# Altium footprint library pcb_library.PcbLib: 45 footprints (part 3 of 3)
Each footprint in its own frame and in the unit in brackets; x right, y up, seen from the top. Pads: shape width x height; smd on the part's side, far side on the other; paste and mask are expansions set on the pad; w line width, h text height; cw(c..) or ccw(c..) is an arc to the next point about the centre after c.
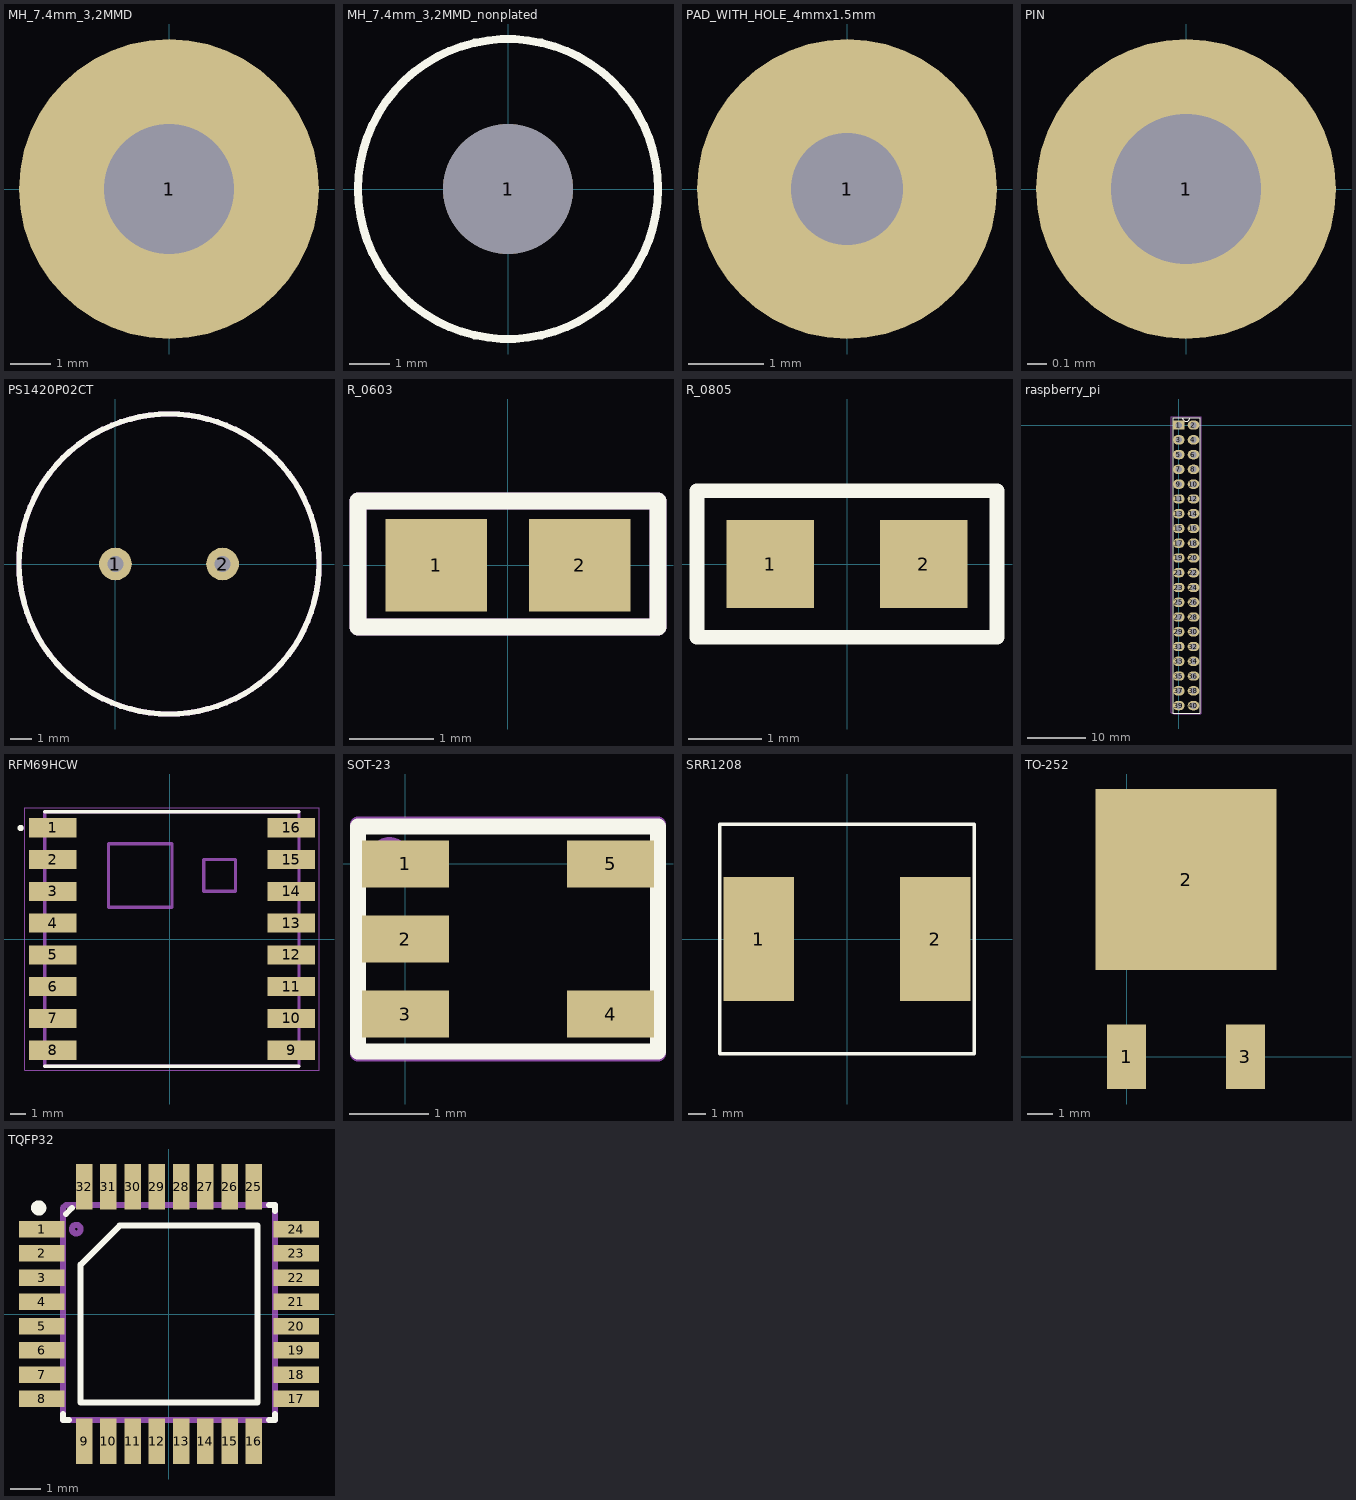
[diagram p2: the footprints below, top view; thin cyan lines are the x and y axes]

## MH_7.4mm_3,2MMD [mm]
pads (1):
  round 7.4 hole 3.2: 1(0,0)

## MH_7.4mm_3,2MMD_nonplated [mm]
pads (1):
  round 3.2 hole 3.2 unplated: 1(0,0)
Top Overlay:
  circle w0.2: c0,0 r3.7

## PAD_WITH_HOLE_4mmx1.5mm [mm]
pads (1):
  round 4 hole 1.5: 1(0,0)

## PIN [mil]
pads (1):
  round 60 hole 30: 1(0,0)

## PS1420P02CT [mil]
pads (2):
  round 60 hole 30: 1(0,0) 2(196.85,0)
Top Overlay:
  circle w10: c98.43,0 r275.59
Mechanical 29:
  circle w10: c98.43,0 r275.59
3D body: height 314.96, standoff 0, extent -177.16,-275.59 374.02,275.59

## R_0603 [mm]
pads (2):
  rect 1.2x1.1 smd: 1(-0.85,0) 2(0.85,0)
Top Overlay:
  lines w0.2: -1.778,-0.73 -1.778,0.478 -1.778,0.762 1.778,0.762 1.778,-0.73 -1.778,-0.73
Mechanical 29:
  lines w0.2: -1.778,-0.73 -1.778,0.762 1.778,0.762 1.778,-0.73 -1.778,-0.73
  text ".Designator" at -1.524,-0.21 h0.8
3D body "RC0603FR-071ML.stp": height 0.55, standoff 0, extent -0.8,-0.4 0.8,0.4

## R_0805 [mm]
pads (2):
  rect 1.2x1.2 smd: 1(-1.05,0) 2(1.05,0)
Top Overlay:
  lines w0.2: -2.05,-1 2.05,-1 2.05,1 -2.05,1 -2.05,0 -2.05,-1
3D body "RC0805FR-0722RL.stp": height 0.6, standoff 0, extent -1,-0.625 1,0.625

## raspberry_pi [mm]
pads (40):
  rect 2x1.6 hole 1.1: 1(0,0)
  oval 2x1.6 hole 1.1: 2(2.54,0) 3(0,-2.54) 4(2.54,-2.54) 5(0,-5.08) 6(2.54,-5.08) 7(0,-7.62) 8(2.54,-7.62) 9(0,-10.16) 10(2.54,-10.16) 11(0,-12.7) 12(2.54,-12.7) 13(0,-15.24) 14(2.54,-15.24) 15(0,-17.78) 16(2.54,-17.78) 17(0,-20.32) 18(2.54,-20.32) 19(0,-22.86) 20(2.54,-22.86) 21(0,-25.4) 22(2.54,-25.4) 23(0,-27.94) 24(2.54,-27.94) 25(0,-30.48) 26(2.54,-30.48) 27(0,-33.02) 28(2.54,-33.02) 29(0,-35.56) 30(2.54,-35.56) 31(0,-38.1) 32(2.54,-38.1) 33(0,-40.64) 34(2.54,-40.64) 35(0,-43.18) 36(2.54,-43.18) 37(0,-45.72) 38(2.54,-45.72) 39(0,-48.26) 40(2.54,-48.26)
Top Overlay:
  lines w0.2: -1,-49.53 -1,1.27 1.905,1.27 cw(c1.27,1.27) 0.635,1.27 3.6,1.27 3.6,-49.53 -1,-49.53
Mechanical 29:
  lines w0.2: -1.3,-49.5 -1.1,-49.5 -0.9,-49.7 3.8,-49.7 3.8,1.4 -0.4,1.4 -1.3,1.4 -1.3,-49.5
3D body "m20-7832046_asm.stp": height 8.31, standoff -3.19, extent -1.22,-49.8 3.82,1.4
3D body "User Library-Raspberry_Pi_Zero.STEP": height 12.55, standoff 8.1, extent -26.484,-56.6 4.746,8.4

## RFM69HCW [mm]
pads (16):
  rect 3x1.2 smd: 1(-7.373,7) 2(-7.373,5) 3(-7.373,3) 4(-7.373,1) 5(-7.373,-1) 6(-7.373,-3) 7(-7.373,-5) 8(-7.373,-7) 9(7.627,-7) 10(7.627,-5) 11(7.627,-3) 12(7.627,-1) 13(7.627,1) 14(7.627,3) 15(7.627,5) 16(7.627,7)
Top Overlay:
  circle w0.2: c-9.398,6.985 r0.1
  lines w0.203: -7.873,-8 8.127,-8 ; -7.873,8 8.127,8
Mechanical 13:
  lines w0.203: -7.873,-8 8.127,-8 8.127,8 -7.873,8 -7.873,-8 ; -3.873,2 -3.873,6 0.127,6 0.127,2 -3.873,2 ; 2.127,3 2.127,5 4.127,5 4.127,3 2.127,3
Mechanical 15:
  lines w0.05: -9.123,-8.25 -9.123,8.25 9.377,8.25 9.377,-8.25 -9.123,-8.25
3D body "RFM69HCW-315S2--3DModel-STEP-56544.STEP": height 1.81, standoff 0.01, extent -7.9,-7.9 8.1,8.1

## SOT-23 [mm]
pads (5):
  rect 1.1x0.6 smd: 1(0,0) 2(0,-0.95) 3(0,-1.9) 4(2.6,-1.9) 5(2.6,0)
Top Overlay:
  lines w0.2: 1.215,0.475 1.538,0.475 ; -0.6,-2.375 3.2,-2.375 3.2,0.475 1.062,0.475 -0.6,0.475 -0.6,-2.375
Mechanical 29:
  circle w0.2: c-0.2,0.1 r0.141
  lines w0.2: -0.6,-2.4 -0.6,0.5 3.2,0.5 3.2,-2.4 -0.6,-2.4
  text ".Designator" at 0.054,-0.879 h0.8
3D body "SN74AHC1G09DBVR.stp": height 1.45, standoff 0, extent -0.1,-2.4 2.7,0.5

## SRR1208 [mm]
pads (2):
  rect 4x7 smd: 1(-5,0) 2(5,0)
Top Overlay:
  lines w0.2: -7.2,-6.5 7.2,-6.5 7.2,6.5 -7.2,6.5 -7.2,-1.8 -7.2,-6.5
3D body "SRR1208-120ML.stp": height 8.26, standoff -0.24, extent -6.35,-6.35 6.35,6.35

## TO-252 [mm]
pads (3):
  rect 1.5x2.5 smd: 1(0,0) 3(4.6,0)
  rect 7x7 smd: 2(2.3,6.85)
3D body "User Library-TO252-2.STEP": height 2.3, standoff 0.01, extent -0.99,-0.79 5.59,9.15

## TQFP32 [mm]
pads (32):
  rect 1.5x0.55 smd mask+0.06: 1(-4.2,2.8) 2(-4.2,2) 3(-4.2,1.2) 4(-4.2,0.4) 5(-4.2,-0.4) 6(-4.2,-1.2) 7(-4.2,-2) 8(-4.2,-2.8) 17(4.2,-2.8) 18(4.2,-2) 19(4.2,-1.2) 20(4.2,-0.4) 21(4.2,0.4) 22(4.2,1.2) 23(4.2,2) 24(4.2,2.8)
  rect 0.55x1.5 smd mask+0.06: 9(-2.8,-4.2) 10(-2,-4.2) 11(-1.2,-4.2) 12(-0.4,-4.2) 13(0.4,-4.2) 14(1.2,-4.2) 15(2,-4.2) 16(2.8,-4.2) 25(2.8,4.2) 26(2,4.2) 27(1.2,4.2) 28(0.4,4.2) 29(-0.4,4.2) 30(-1.2,4.2) 31(-2,4.2) 32(-2.8,4.2)
Top Overlay:
  circle w0.3: c-4.3,3.5 r0.1
  lines w0.2: -3.5,-3.3 -3.5,-3.5 -3.3,-3.5 ; -3.4,3.3 -3.2,3.5 ; 3.3,-3.5 3.5,-3.5 3.5,-3.3 ; 3.3,3.6 3.5,3.6 3.5,3.4 ; -2.915,-2.915 2.915,-2.915 2.915,2.915 -1.63,2.915 -2.915,1.63 -2.915,-2.915
Mechanical 29:
  circle w0.2: c-3.059,2.8 r0.141
  lines w0.2: -3.5,-3.5 -3.5,3.5 -3.4,3.6 3.5,3.6 3.5,-3.5 -3.5,-3.5
  text ".Designator" at -1.546,-0.279 h0.8
3D body "User Library-tqfp32.step": height 1.2, standoff 0, extent -4.602,-4.599 4.596,4.6